# Altium footprint library 4wheel sensor board.PcbLib: 22 footprints (part 1 of 2)
Each footprint in its own frame and in the unit in brackets; x right, y up, seen from the top. Pads: shape width x height; smd on the part's side, far side on the other; paste and mask are expansions set on the pad; w line width, h text height; cw(c..) or ccw(c..) is an arc to the next point about the centre after c.
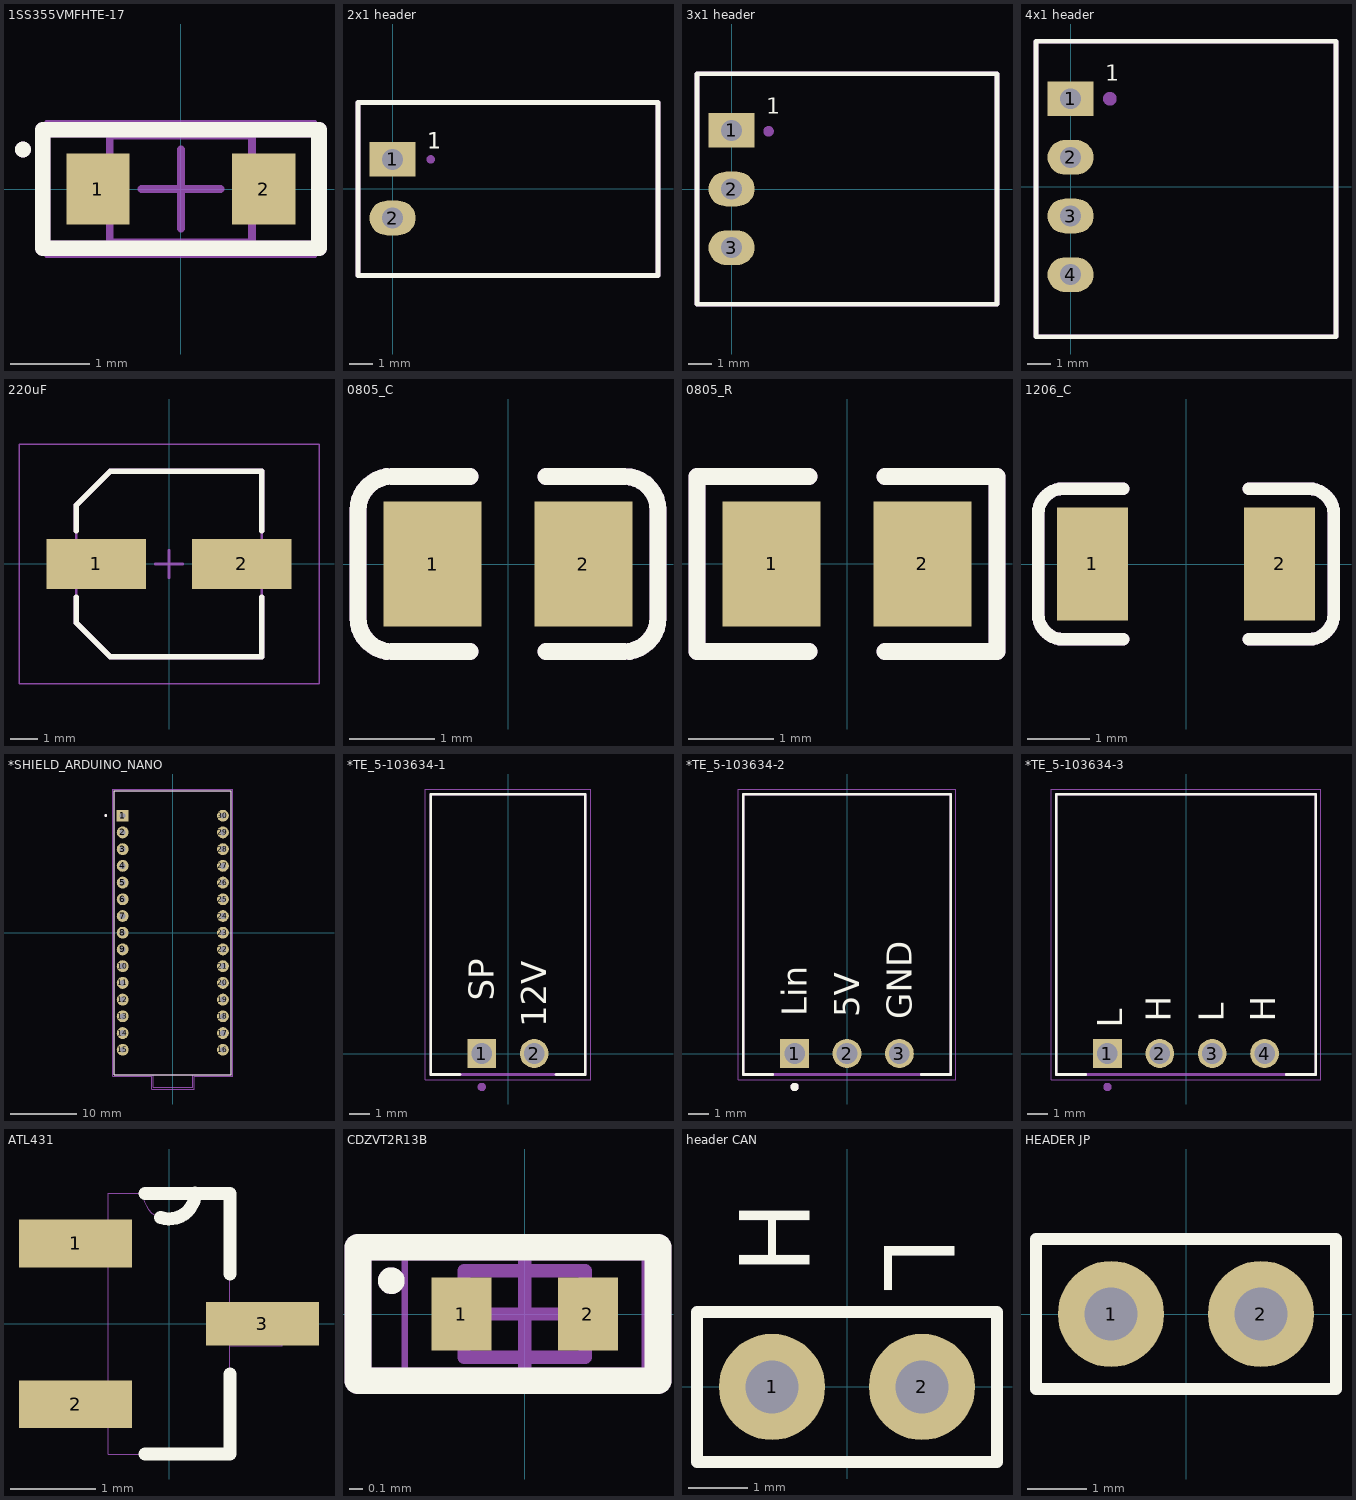
[diagram p0: the footprints below, top view; thin cyan lines are the x and y axes]

## 1SS355VMFHTE-17 [mm]
height 0.9
pads (2):
  rect 0.8x0.9 smd: 1(-1.05,0) 2(1.05,0)
Top Overlay:
  circle w0.1: c-2,0.5 r0.05
  lines w0.2: -1.75,-0.75 1.75,-0.75 1.75,0.75 1.125,0.75 0.188,0.75 -0.188,0.75 -1.125,0.75 -1.75,0.75 -1.75,-0.75
Mechanical 1:
  text "'.Designator'" at 0,0 h0.7
Top Courtyard:
  lines w0.05: -1.7,-0.85 -1.7,0.85 1.7,0.85 1.7,-0.85 -1.7,-0.85
  lines w0.1: -0.5,0 0.5,0 ; 0,-0.5 0,0.5
Top Assembly:
  lines w0.1: -0.9,-0.675 -0.9,0.675 0.9,0.675 0.9,-0.675 -0.9,-0.675
Mechanical 29:
  circle w0.1: c-2,0.5 r0.05
  lines w0.2: -1.75,-0.75 1.75,-0.75 1.75,0.75 1.125,0.75 0.188,0.75 -0.188,0.75 -1.125,0.75 -1.75,0.75 -1.75,-0.75
Mechanical 30:
  text "'.Designator'" at 0,0 h1.54
3D body "1SS355VMFHTE-17 .step": height 0.9, standoff 0, extent -1.25,-0.675 1.25,0.675

## 2x1 header [mm]
pads (2):
  rect 2x1.5 hole 0.9: 1(0,1.27)
  oval 2x1.5 hole 0.9: 2(0,-1.27)
Top Overlay:
  lines w0.2: -1.5,-3.775 -1.5,3.725 11.5,3.725 11.5,-3.775 -1.5,-3.775 ; -1.5,-3.75 11.5,-3.75 11.5,3.75 -1.5,3.75 -1.5,-3.75
  text "1" at 1.5,1.725 h0.7
  text "1" at 1.5,1.75 h0.7
Mechanical 1:
  text "'.Designator'" at 0,0 h0.7
Mechanical 30:
  circle w0.254: c1.65,1.27 r0.054
  lines w0.2: -1.5,-3.775 11.5,-3.775 11.5,3.725 -1.5,3.725 -1.5,-3.775 ; -1.5,-3.75 -1.5,3.75 11.5,3.75 11.5,-3.75 -1.5,-3.75
  text "1" at 1.5,1.75 h0.7
  text "1" at 1.5,1.725 h0.7

## 3x1 header [mm]
pads (3):
  rect 2x1.5 hole 0.9: 1(0,2.54)
  oval 2x1.5 hole 0.9: 2(0,0) 3(0,-2.54)
Top Overlay:
  lines w0.2: -1.5,-5 -1.5,5 11.5,5 11.5,-5 -1.5,-5
  text "1" at 1.5,3.25 h0.7
Mechanical 1:
  text "'.Designator'" at 0,0 h0.7
Mechanical 30:
  circle w0.254: c1.6,2.5 r0.1
  lines w0.2: -1.5,-5 11.5,-5 11.5,5 -1.5,5 -1.5,-5
  text "1" at 1.5,3.25 h0.7

## 4x1 header [mm]
pads (4):
  rect 2x1.5 hole 0.9: 1(0,3.81)
  oval 2x1.5 hole 0.9: 2(0,1.27) 3(0,-1.27) 4(0,-3.81)
Top Overlay:
  lines w0.2: -1.5,-6.5 11.5,-6.5 11.5,6.3 -1.5,6.3 -1.5,-6.5
  text "1" at 1.5,4.6 h0.7
Mechanical 1:
  text "'.Designator'" at 0,0 h0.7
Mechanical 30:
  circle w0.3: c1.7,3.81 r0.149
  lines w0.2: -1.5,-6.5 -1.5,6.3 11.5,6.3 11.5,-6.5 -1.5,-6.5
  text "1" at 1.5,4.6 h0.7

## 220uF [mm] "Aluminum Electrolytic Capacitor, Body 6.60x6.60x6.90mm, IPC Low Density"
height 6.9
pads (2):
  rect 3.65x1.85 smd: 1(-2.675,0) 2(2.675,0)
Top Overlay:
  lines w0.2: -3.4,-1.225 -3.4,-2.163 -2.163,-3.4 3.4,-3.4 3.4,-1.225 ; -3.4,1.225 -3.4,2.163 -2.163,3.4 3.4,3.4 3.4,1.225
Mechanical 1:
  text "'.Designator'" at 0,0 h1.54
Top Courtyard:
  lines w0.05: -5.5,-4.4 5.5,-4.4 5.5,4.4 -5.5,4.4 -5.5,-4.4
  lines w0.1: -0.5,0 0.5,0 ; 0,-0.5 0,0.5
Top Assembly:
  lines w0.1: -3.4,-2.163 -3.4,2.163 -2.163,3.4 3.4,3.4 3.4,-3.4 -2.163,-3.4 -3.4,-2.163
Mechanical 29:
  lines w0.2: -3.4,-1.225 -3.4,-2.163 -2.163,-3.4 3.4,-3.4 3.4,-1.225 ; -3.4,1.225 -3.4,2.163 -2.163,3.4 3.4,3.4 3.4,1.225
Mechanical 30:
  text "'.Designator'" at 0,0 h1.54
3D body: height 6.9, standoff 0, extent -3.4,-3.4 3.4,3.4
3D body: height 2.3, standoff 0, extent -3.4,-3.4 3.4,3.4

## 0805_C [mm]
pads (2):
  rect 1.16x1.47 smd: 1(-0.89,0) 2(0.89,0)
Top Overlay:
  lines w0.2: -0.45,-1.035 -1.37,-1.035 cw(c-1.37,-0.635) -1.77,-0.635 -1.77,0.635 cw(c-1.37,0.635) -1.37,1.035 -0.45,1.035 ; 0.45,-1.035 1.37,-1.035 ccw(c1.37,-0.635) 1.77,-0.635 1.77,0.635 ccw(c1.37,0.635) 1.37,1.035 0.45,1.035
Mechanical 29:
  lines w0.2: -0.45,-1.035 -1.37,-1.035 cw(c-1.37,-0.635) -1.77,-0.635 -1.77,0.635 cw(c-1.37,0.635) -1.37,1.035 -0.45,1.035 ; 0.45,-1.035 1.37,-1.035 ccw(c1.37,-0.635) 1.77,-0.635 1.77,0.635 ccw(c1.37,0.635) 1.37,1.035 0.45,1.035
Mechanical 30:
  text "'.Designator'" at 0,0 h1.54
3D body "User Library-0805 SMD Capacitor.STEP": height 0.77, standoff -0.01, extent -0.999,-0.625 1.001,0.625

## 0805_R [mm]
pads (2):
  rect 1.16x1.47 smd: 1(-0.89,0) 2(0.89,0)
Top Overlay:
  lines w0.2: -0.45,-1.035 -1.77,-1.035 -1.77,1.035 -0.45,1.035 ; 0.45,-1.035 1.77,-1.035 1.77,1.035 0.45,1.035
Mechanical 29:
  lines w0.2: -0.45,-1.035 -1.77,-1.035 -1.77,1.035 -0.45,1.035 ; 0.45,-1.035 1.77,-1.035 1.77,1.035 0.45,1.035
Mechanical 30:
  text "'.Designator'" at 0,0 h1.54
3D body "User Library-R_0805.STEP": height 0.49, standoff -0.01, extent -0.997,-0.625 1.003,0.625

## 1206_C [mm]
pads (2):
  rect 1.13x1.8 smd: 1(-1.49,0) 2(1.49,0)
Top Overlay:
  lines w0.2: -1,-1.2 -1.955,-1.2 cw(c-1.955,-0.8) -2.355,-0.8 -2.355,0.8 cw(c-1.955,0.8) -1.955,1.2 -1,1.2 ; 1,-1.2 1.955,-1.2 ccw(c1.955,-0.8) 2.355,-0.8 2.355,0.8 ccw(c1.955,0.8) 1.955,1.2 1,1.2
Mechanical 29:
  lines w0.2: -1,-1.2 -1.955,-1.2 cw(c-1.955,-0.8) -2.355,-0.8 -2.355,0.8 cw(c-1.955,0.8) -1.955,1.2 -1,1.2 ; 1,-1.2 1.955,-1.2 ccw(c1.955,-0.8) 2.355,-0.8 2.355,0.8 ccw(c1.955,0.8) 1.955,1.2 1,1.2
Mechanical 30:
  text "'.Designator'" at 0,0 h1.54
3D body "C1206.STEP": height 1, standoff 0, extent -1.602,-0.813 1.598,0.787

## *SHIELD_ARDUINO_NANO [mm]
pads (30):
  rect 1.8x1.8 hole 0.9: 1(-7.62,17.78)
  round 1.8 hole 0.9: 2(-7.62,15.24) 3(-7.62,12.7) 4(-7.62,10.16) 5(-7.62,7.62) 6(-7.62,5.08) 7(-7.62,2.54) 8(-7.62,0) 9(-7.62,-2.54) 10(-7.62,-5.08) 11(-7.62,-7.62) 12(-7.62,-10.16) 13(-7.62,-12.7) 14(-7.62,-15.24) 15(-7.62,-17.78) 16(7.62,-17.78) 17(7.62,-15.24) 18(7.62,-12.7) 19(7.62,-10.16) 20(7.62,-7.62) 21(7.62,-5.08) 22(7.62,-2.54) 23(7.62,0) 24(7.62,2.54) 25(7.62,5.08) 26(7.62,7.62) 27(7.62,10.16) 28(7.62,12.7) 29(7.62,15.24) 30(7.62,17.78)
Top Overlay:
  circle w0.2: c-10.2,17.8 r0.1
  lines w0.127: -8.89,-21.59 -8.89,21.59 8.89,21.59 8.89,-21.59 -8.89,-21.59
Mechanical 4:
  circle w0.2: c-10.2,17.8 r0.1
  circle w0.2: c-10.2,17.8 r0.1
  lines w0.127: -8.89,-21.59 -8.89,21.59 ; -8.89,-21.59 -2.97,-21.59 ; -8.89,-21.59 -8.89,21.59 ; -8.89,-21.59 -2.97,-21.59 ; -8.89,21.59 8.89,21.59 ; -8.89,21.59 8.89,21.59 ; -2.97,-23.495 3,-23.495 ; -2.97,-23.495 -2.97,-21.59 ; -2.97,-23.495 3,-23.495 ; -2.97,-23.495 -2.97,-21.59 ; -2.97,-21.59 3,-21.59 ; -2.97,-21.59 3,-21.59 ; 3,-23.495 3,-21.59 ; 3,-23.495 3,-21.59 ; 3,-21.59 8.89,-21.59 ; 3,-21.59 8.89,-21.59 ; 8.89,-21.59 8.89,21.59 ; 8.89,-21.59 8.89,21.59
Mechanical 16:
  lines w0.05: -9.14,-21.84 -3.22,-21.84 -3.22,-23.745 3.25,-23.745 3.25,-21.84 9.14,-21.84 9.14,21.84 -9.14,21.84 -9.14,-21.84
3D body "arduino nano.SLDPRT": height 12.61, standoff -5.99, extent -9,-23.4 9,21.6

## *TE_5-103634-1 [mm]
pads (2):
  rect 1.398x1.398 hole 1: 1(-1.27,0)
  round 1.398 hole 1: 2(1.27,0)
Top Overlay:
  lines w0.127: -2.326,-1.02 -3.75,-1.02 -3.75,12.57 3.75,12.57 3.75,-1.02 2.326,-1.02
  text "SP" at -0.69,2.55 h1.2
  text "12V" at 1.85,1.28 h1.2
Top Courtyard:
  circle w0.2: c-1.27,-1.62 r0.1
  circle w0.2: c-1.27,-1.62 r0.1
  lines w0.127: -3.75,-1.02 3.75,-1.02 ; -3.75,-1.02 -3.75,12.57 ; -3.75,-1.02 3.75,-1.02 ; -3.75,-1.02 -3.75,12.57 ; -3.75,12.57 3.75,12.57 ; -3.75,12.57 3.75,12.57 ; 3.75,-1.02 3.75,12.57 ; 3.75,-1.02 3.75,12.57
Mechanical 16:
  lines w0.05: -4,-1.27 -4,12.82 4,12.82 4,-1.27 -4,-1.27
Mechanical 29:
  circle w0.2: c-1.27,-1.62 r0.1
  lines w0.127: -2.326,-1.02 -3.75,-1.02 -3.75,12.57 3.75,12.57 3.75,-1.02 2.326,-1.02
Mechanical 30:
  text "'.Designator'" at 0,0 h1.54
3D body "31507.stp": height 7, standoff -3.29, extent -3.82,-1.069 3.8,12.519

## *TE_5-103634-2 [mm]
pads (3):
  rect 1.398x1.398 hole 1: 1(-2.54,0)
  round 1.398 hole 1: 2(0,0) 3(2.54,0)
Top Overlay:
  circle w0.2: c-2.54,-1.62 r0.1
  lines w0.127: -3.596,-1.02 -5.02,-1.02 -5.02,12.57 5.02,12.57 5.02,-1.02 3.596,-1.02
  text "5V" at 0.6,1.75 h1.2
  text "Lin" at -1.94,1.8 h1.2
  text "GND" at 3.14,1.65 h1.2
Top Courtyard:
  circle w0.2: c-2.54,-1.62 r0.1
  circle w0.2: c-2.54,-1.62 r0.1
  lines w0.127: -5.02,-1.02 5.02,-1.02 ; -5.02,-1.02 -5.02,12.57 ; -5.02,-1.02 5.02,-1.02 ; -5.02,-1.02 -5.02,12.57 ; -5.02,12.57 5.02,12.57 ; -5.02,12.57 5.02,12.57 ; 5.02,-1.02 5.02,12.57 ; 5.02,-1.02 5.02,12.57
Mechanical 16:
  lines w0.05: -5.27,-1.27 -5.27,12.82 5.27,12.82 5.27,-1.27 -5.27,-1.27
Mechanical 29:
  circle w0.2: c-2.54,-1.62 r0.1
  lines w0.127: -3.596,-1.02 -5.02,-1.02 -5.02,12.57 5.02,12.57 5.02,-1.02 3.596,-1.02
Mechanical 30:
  text "'.Designator'" at 0,0 h1.54
3D body "31508.stp": height 7, standoff -3.29, extent -5.06,-0.994 5.1,12.594

## *TE_5-103634-3 [mm]
pads (4):
  rect 1.398x1.398 hole 1: 1(-3.81,0)
  round 1.398 hole 1: 2(-1.27,0) 3(1.27,0) 4(3.81,0)
Top Overlay:
  lines w0.127: -4.866,-1.02 -6.29,-1.02 -6.29,12.57 6.29,12.57 6.29,-1.02 4.866,-1.02
  text "L" at -3.085,1.24 h1.2
  text "H" at -0.745,1.535 h1.2
  text "L" at 1.83,1.535 h1.2
  text "H" at 4.335,1.535 h1.2
Top Courtyard:
  circle w0.2: c-3.81,-1.62 r0.1
  circle w0.2: c-3.81,-1.62 r0.1
  lines w0.127: -6.29,-1.02 -6.29,12.57 ; -6.29,-1.02 6.29,-1.02 ; -6.29,-1.02 -6.29,12.57 ; -6.29,-1.02 6.29,-1.02 ; -6.29,12.57 6.29,12.57 ; -6.29,12.57 6.29,12.57 ; 6.29,-1.02 6.29,12.57 ; 6.29,-1.02 6.29,12.57
Mechanical 16:
  lines w0.05: -6.54,-1.27 6.54,-1.27 6.54,12.82 -6.54,12.82 -6.54,-1.27
Mechanical 29:
  circle w0.2: c-3.81,-1.62 r0.1
  lines w0.127: -4.866,-1.02 -6.29,-1.02 -6.29,12.57 6.29,12.57 6.29,-1.02 4.866,-1.02
Mechanical 30:
  text "'.Designator'" at 0,0 h1.54
3D body "31509.stp": height 7, standoff -3.29, extent -6.325,-0.994 6.375,12.594

## ATL431 [mil]
pads (3):
  rect 52x22 smd: 1(-43,37) 2(-43,-37)
  rect 52x20 smd: 3(43,0)
Top Overlay:
  lines w6: -11,-60 28,-60 28,-23 ; -11,60 12,60 28,60 28,23 ; -3.9,48.96 ccw(c0.15,60.1) 12,60.1
Mechanical 4:
  lines w0: -52,-47 -28,-47 ; -52,-47 -52,-28 ; -52,-47 -28,-47 ; -52,-47 -52,-28 ; -52,-28 -28,-28 ; -52,-28 -28,-28 ; -52,28 -28,28 ; -52,28 -52,47 ; -52,28 -28,28 ; -52,28 -52,47 ; -52,47 -28,47 ; -52,47 -28,47 ; -28,-60 -28,-47 ; -28,-60 28,-60 ; -28,-60 -28,-47 ; -28,-60 28,-60 ; -28,-47 -28,-28 ; -28,-47 -28,-28 ; -28,-28 -28,28 ; -28,-28 -28,28 ; -28,28 -28,47 ; -28,28 -28,47 ; -28,47 -28,60 ; -28,47 -28,60 ; -28,60 -12,60 ; -28,60 -12,60 ; -12,60 ccw(c0,60) 12,60 ; -12,60 ccw(c0,60) 12,60 ; -12,60 12,60 ; -12,60 12,60 ; 12,60 28,60 ; 12,60 28,60 ; 28,-60 28,-10 ; 28,-60 28,-10 ; 28,-10 52,-10 ; 28,-10 28,10 ; 28,-10 52,-10 ; 28,-10 28,10 ; 28,10 52,10 ; 28,10 28,60 ; 28,10 52,10 ; 28,10 28,60 ; 52,-10 52,10 ; 52,-10 52,10

## CDZVT2R13B [mm]
height 0.4
pads (2):
  rect 0.45x0.55 smd: 1(-0.475,0) 2(0.475,0)
Top Overlay:
  circle w0.1: c-1,0.25 r0.05
  lines w0.2: -1.25,-0.5 -1.25,0.5 1,0.5 1,-0.5 -1.25,-0.5
Mechanical 1:
  text "'.Designator'" at 0,0 h0.7
Top Courtyard:
  lines w0.05: -0.9,-0.5 0.9,-0.5 0.9,0.5 -0.9,0.5 -0.9,-0.5
  lines w0.1: -0.5,0 0.5,0 ; 0,-0.5 0,0.5
Top Assembly:
  lines w0.1: -0.455,-0.325 0.455,-0.325 0.455,0.325 -0.455,0.325 -0.455,-0.325
Mechanical 29:
  circle w0.1: c-1,0.25 r0.05
  lines w0.2: -1.25,-0.5 -1.25,0.5 1,0.5 1,-0.5 -1.25,-0.5
Mechanical 30:
  text "'.Designator'" at 0,0 h1.54
3D body "CDZVT2R13B .step": height 0.4, standoff 0, extent -0.5,-0.325 0.5,0.325

## header CAN [mm]
pads (2):
  round 1.8 hole 0.9: 1(-1.27,0) 2(1.27,0)
Top Overlay:
  lines w0.2: -2.54,-1.27 -2.54,1.27 2.54,1.27 2.54,-1.27 -2.54,-1.27
  text "H" at -0.635,1.905 h1.2
  text "L" at 0.635,2.54 h1.2
3D body "逼皐2pin.SLDPRT": height 8.51, standoff -7.49, extent -2.54,-1.27 2.54,1.27

## HEADER JP [mm]
pads (2):
  round 1.8 hole 0.9: 1(-1.27,0) 2(1.27,0)
Top Overlay:
  lines w0.2: -2.54,-1.27 -2.54,1.27 2.54,1.27 2.54,-1.27 -2.54,-1.27
3D body "逼皐2pin.SLDPRT": height 8.51, standoff -7.49, extent -2.54,-1.27 2.54,1.27